# Altium footprint library ICs.PcbLib: 86 footprints (part 6 of 6)
Each footprint in its own frame and in the unit in brackets; x right, y up, seen from the top. Pads: shape width x height; smd on the part's side, far side on the other; paste and mask are expansions set on the pad; w line width, h text height; cw(c..) or ccw(c..) is an arc to the next point about the centre after c.
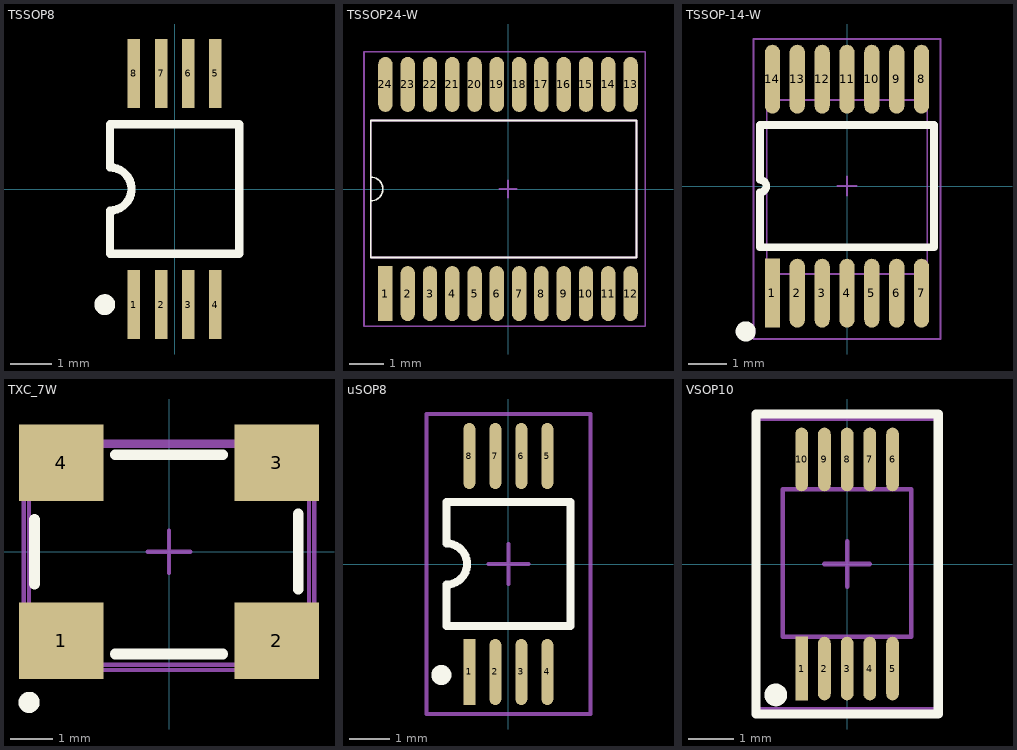
[diagram p5: the footprints below, top view; thin cyan lines are the x and y axes]

## TSSOP8 [mm] "Shrink Small Outline, Plastic, Thin; 8 Leads; Body Width 4.4 mm; Pitch 0.65 mm"
height 1.1
pads (8):
  rect 0.3x1.65 smd: 1(-0.975,-2.775) 2(-0.325,-2.775) 3(0.325,-2.775) 4(0.975,-2.775) 5(0.975,2.775) 6(0.325,2.775) 7(-0.325,2.775) 8(-0.975,2.775)
Top Overlay:
  circle w0.25: c-1.675,-2.775 r0.125
  lines w0.2: -1.55,-1.55 -1.55,-0.517 ccw(c-1.55,0) -1.55,0.517 -1.55,1.55 1.55,1.55 1.55,-1.55 -1.55,-1.55
3D body: height 1, standoff 0, extent -1.524,-1.524 1.524,1.524

## TSSOP24-W [mm]
pads (24):
  rect 0.42x1.6 smd: 1(-3.575,-3.05)
  oval 0.42x1.6 smd: 2(-2.925,-3.05) 3(-2.275,-3.05) 4(-1.625,-3.05) 5(-0.975,-3.05) 6(-0.325,-3.05) 7(0.325,-3.05) 8(0.975,-3.05) 9(1.625,-3.05) 10(2.275,-3.05) 11(2.925,-3.05) 12(3.575,-3.05) 13(3.575,3.05) 14(2.925,3.05) 15(2.275,3.05) 16(1.625,3.05) 17(0.975,3.05) 18(0.325,3.05) 19(-0.325,3.05) 20(-0.975,3.05) 21(-1.625,3.05) 22(-2.275,3.05) 23(-2.925,3.05) 24(-3.575,3.05)
Top Overlay:
  lines w0.05: -4,-0.35 ccw(c-4,0) -4,0.35 ; -4,-2 -4,2 3.75,2 3.75,-2 -4,-2
Mechanical 1:
  lines w0.05: -4,-2 -4,2 3.75,2 3.75,-2 -4,-2
Mechanical 15:
  lines w0.05: -0.25,0 0.25,0 ; 0,-0.25 0,0.25 ; -4.2,-4 -4.2,4 4,4 4,-4 -4.2,-4
3D body: height 1, standoff 0, extent -4,-2 3.75,2

## TSSOP-14-W [mm]
pads (14):
  rect 0.4x1.8 smd: 1(-1.95,-2.8)
  oval 0.4x1.8 smd: 2(-1.3,-2.8) 3(-0.65,-2.8) 4(0,-2.8) 5(0.65,-2.8) 6(1.3,-2.8) 7(1.95,-2.8) 8(1.95,2.8) 9(1.3,2.8) 10(0.65,2.8) 11(0,2.8) 12(-0.65,2.8) 13(-1.3,2.8) 14(-1.95,2.8)
Top Overlay:
  circle w0.3: c-2.65,-3.8 r0.112
  lines w0.2: -2.275,-1.6 -2.275,-0.162 ccw(c-2.275,0) -2.275,0.162 -2.275,1.6 2.275,1.6 2.275,-1.6 -2.275,-1.6
Mechanical 1:
  lines w0.05: -2.1,-2.3 -2.1,2.25 2.1,2.25 2.1,-2.3 -2.1,-2.3
Mechanical 15:
  circle w0.3: c-2.65,-3.8 r0.1
  lines w0.05: -0.25,0 0.25,0 ; 0,-0.25 0,0.25 ; -2.45,-4 -2.45,3.85 2.45,3.85 2.45,-4 -2.45,-4
3D body: height 1, standoff 0, extent -2.1,-2.3 2.1,2.25

## TXC_7W [mm]
height 1.3
pads (4):
  rect 2x1.8 smd: 1(-2.54,-2.1) 2(2.54,-2.1) 3(2.54,2.1) 4(-2.54,2.1)
Top Overlay:
  circle w0.25: c-3.302,-3.556 r0.125
  lines w0.254: -3.175,-0.762 -3.175,0.762 ; -1.27,-2.413 1.27,-2.413 ; -1.27,2.286 1.27,2.286 ; 3.048,-0.889 3.048,0.889
Mechanical 1:
  lines w0.1: -3.302,-2.667 -3.302,2.5 3.302,2.5 3.302,-2.667 -3.302,-2.667
Mechanical 15:
  lines w0.1: -0.5,0 0.5,0 ; 0,-0.5 0,0.5 ; -3.429,-2.794 -3.429,2.6 3.429,2.6 3.429,-2.794 -3.429,-2.794
3D body: height 1.3, standoff 0, extent -3.175,-2.413 3.048,2.246

## uSOP8 [mm] "Shrink Small Outline, Plastic, Thin; 8 Leads; Body Width 4.4 mm; Pitch 0.65 mm"
height 1.1
pads (8):
  rect 0.3x1.65 smd: 1(-0.975,-2.7)
  oval 0.3x1.65 smd: 2(-0.325,-2.7) 3(0.325,-2.7) 4(0.975,-2.7) 5(0.975,2.7) 6(0.325,2.7) 7(-0.325,2.7) 8(-0.975,2.7)
Top Overlay:
  circle w0.25: c-1.675,-2.775 r0.125
  lines w0.2: -1.55,-1.55 1.55,-1.55 1.55,1.55 -1.55,1.55 -1.55,0.517 cw(c-1.55,0) -1.55,-0.517 -1.55,-1.55
Mechanical 1:
  circle w0.1: c-1.65,-2.8 r0.1
Mechanical 15:
  lines w0.1: -0.5,0 0.5,0 ; 0,-0.5 0,0.5 ; -2.05,-3.75 2.05,-3.75 2.05,3.75 -2.05,3.75 -2.05,-3.75
3D body: height 1, standoff 0, extent -1.524,-1.524 1.524,1.524

## VSOP10 [mm]
height 1.85
pads (10):
  rect 0.28x1.4 smd: 1(-1,-2.3)
  oval 0.28x1.4 smd: 2(-0.5,-2.3) 3(0,-2.3) 4(0.5,-2.3) 5(1,-2.3) 6(1,2.3) 7(0.5,2.3) 8(0,2.3) 9(-0.5,2.3) 10(-1,2.3)
Top Overlay:
  circle w0.25: c-1.57,-2.88 r0.125
  lines w0.2: -2,-3.3 -2,3.3 2.005,3.3 2.005,-3.3 -2,-3.3
Mechanical 1:
  lines w0.1: -1.415,-1.605 -1.415,1.645 1.415,1.645 1.415,-1.605 -1.415,-1.605
Mechanical 15:
  circle w0.1: c-1.6,-2.88 r0.1
  lines w0.1: -0.5,0 0.5,0 ; 0,-0.5 0,0.5 ; -2.01,-3.2 -2.01,3.2 2.005,3.2 2.005,-3.2 -2.01,-3.2
3D body: height 1.85, standoff 0, extent -1.415,-1.62 1.41,1.65